# Altium footprint library Pcb-hionyPcbLib.PcbLib: 580 footprints (part 33 of 37)
Each footprint in its own frame and in the unit in brackets; x right, y up, seen from the top. Pads: shape width x height; smd on the part's side, far side on the other; paste and mask are expansions set on the pad; w line width, h text height; cw(c..) or ccw(c..) is an arc to the next point about the centre after c.
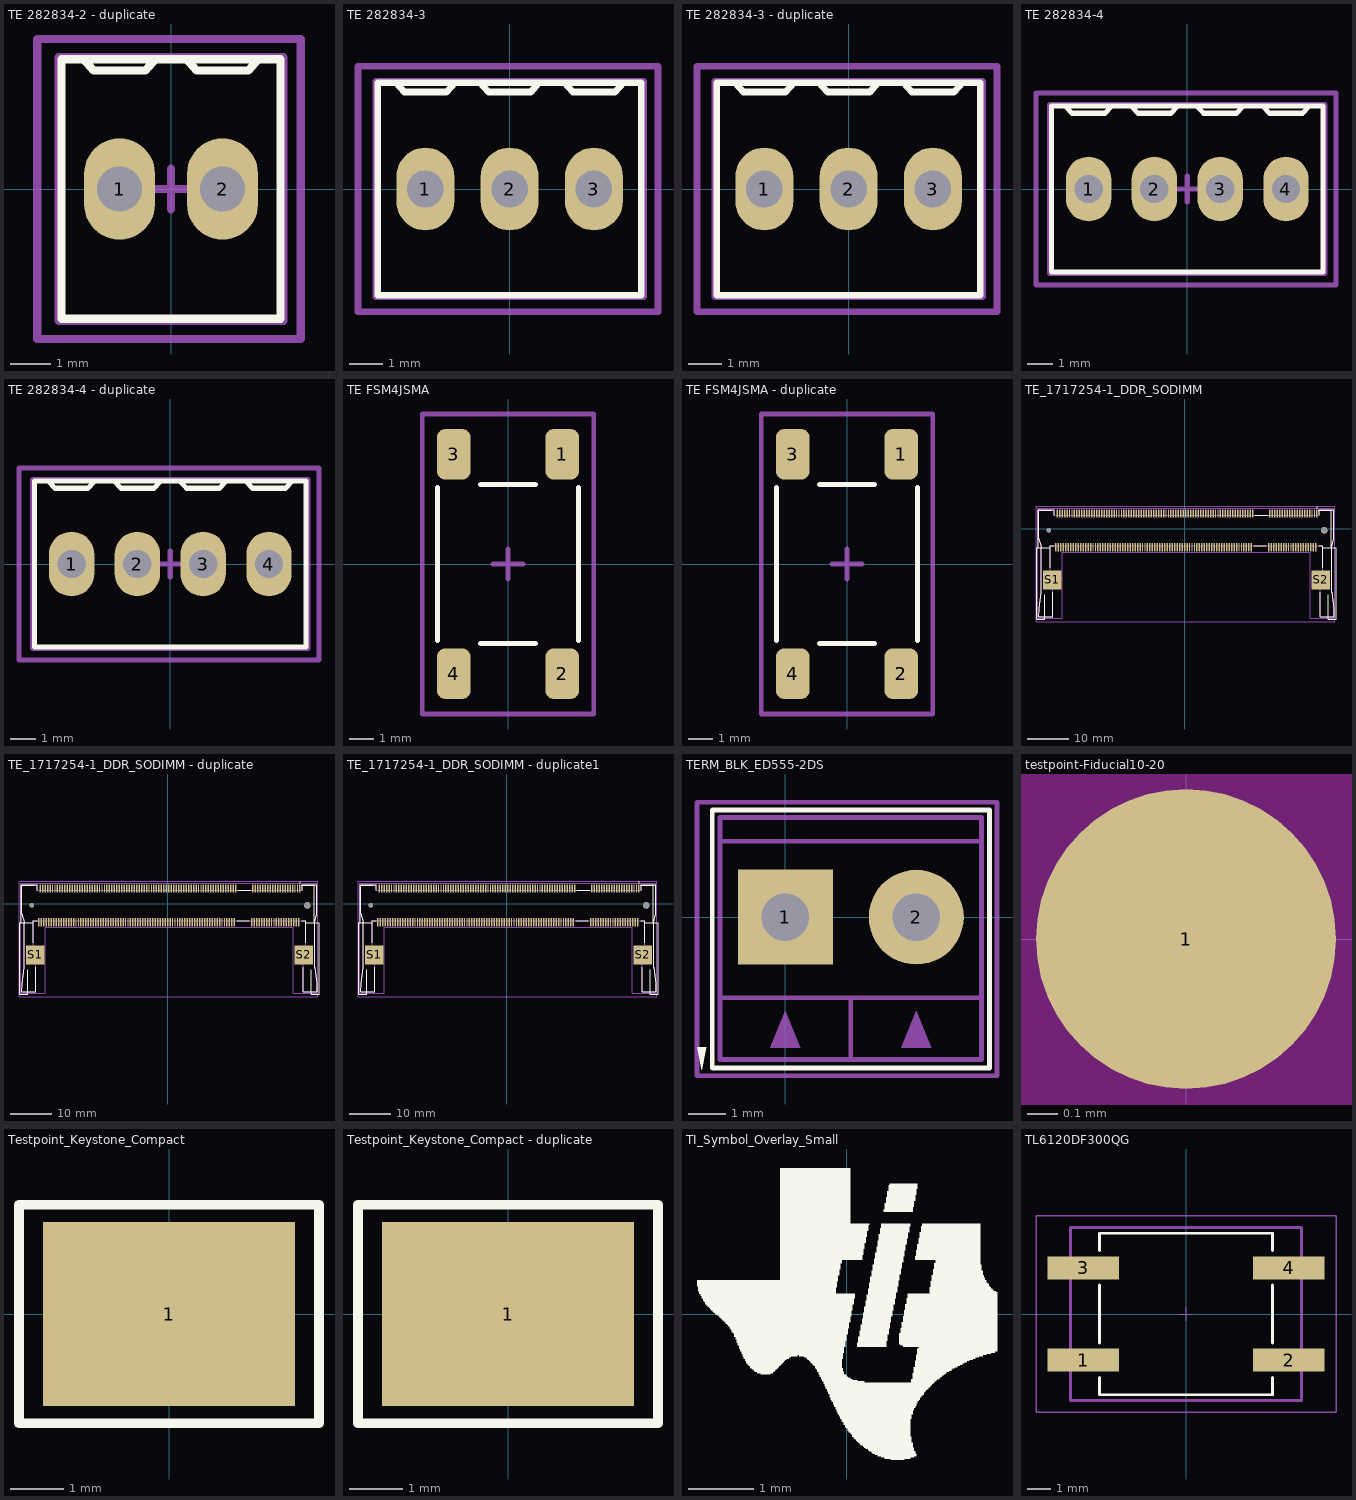
[diagram p32: the footprints below, top view; thin cyan lines are the x and y axes]

## TE 282834-2 - duplicate [mm]
pads (2):
  oval 1.75x2.5 hole 1.1: 1(-1.27,0) 2(1.27,0)
Top Overlay:
  lines w0.2: -2.159,3.2 -1.905,2.921 -0.635,2.921 -0.381,3.2 ; 0.381,3.2 0.635,2.921 1.905,2.921 2.159,3.2 ; -2.7,-3.2 -2.6,-3.2 2.7,-3.2 2.7,3.2 -2.7,3.2 -2.7,-3.2
Mechanical 13:
  lines w0.2: -2.77,-3.25 -2.77,3.25 2.77,3.25 2.77,-3.25 -2.77,-3.25
Mechanical 15:
  lines w0.2: -0.5,0 0.5,0 ; 0,-0.5 0,0.5 ; -3.3,-3.7 3.2,-3.7 3.2,-2.9 3.2,3.7 -3.3,3.7 -3.3,-3.3 -3.3,-3.7
3D body "TE Term Block 2port 282834-2-c-3d.STEP": height 10, standoff -3.4, extent -2.77,-3.25 2.77,3.25

## TE 282834-3 [mm]
pads (3):
  oval 1.75x2.5 hole 1.1: 1(-2.54,0) 2(0,0) 3(2.54,0)
Top Overlay:
  lines w0.2: -3.429,3.2 -3.175,2.921 -1.905,2.921 -1.651,3.2 ; -0.889,3.2 -0.635,2.921 0.635,2.921 0.889,3.2 ; 1.651,3.2 1.905,2.921 3.175,2.921 3.429,3.2 ; -3.97,-3.2 -3.87,-3.2 3.97,-3.2 3.97,3.2 -3.97,3.2 -3.97,-3.2
Mechanical 13:
  lines w0.2: -4.04,-3.25 -4.04,3.25 4.04,3.25 4.04,-3.25 -4.04,-3.25
Mechanical 15:
  lines w0.2: -0.5,0 0.5,0 ; 0,-0.5 0,0.5 ; -4.57,-3.7 4.47,-3.7 4.47,-2.9 4.47,3.7 -4.57,3.7 -4.57,-3.3 -4.57,-3.7
3D body "TE Term Block 3port 282834-3-c-3d.STEP": height 10, standoff -3.4, extent -4.04,-3.25 4.04,3.25

## TE 282834-3 - duplicate [mm]
pads (3):
  oval 1.75x2.5 hole 1.1: 1(-2.54,0) 2(0,0) 3(2.54,0)
Top Overlay:
  lines w0.2: -3.429,3.2 -3.175,2.921 -1.905,2.921 -1.651,3.2 ; -0.889,3.2 -0.635,2.921 0.635,2.921 0.889,3.2 ; 1.651,3.2 1.905,2.921 3.175,2.921 3.429,3.2 ; -3.97,-3.2 -3.87,-3.2 3.97,-3.2 3.97,3.2 -3.97,3.2 -3.97,-3.2
Mechanical 13:
  lines w0.2: -4.04,-3.25 -4.04,3.25 4.04,3.25 4.04,-3.25 -4.04,-3.25
Mechanical 15:
  lines w0.2: -0.5,0 0.5,0 ; 0,-0.5 0,0.5 ; -4.57,-3.7 4.47,-3.7 4.47,-2.9 4.47,3.7 -4.57,3.7 -4.57,-3.3 -4.57,-3.7
3D body "TE Term Block 3port 282834-3-c-3d.STEP": height 10, standoff -3.4, extent -4.04,-3.25 4.04,3.25

## TE 282834-4 [mm]
pads (4):
  oval 1.75x2.5 hole 1.1: 1(-3.81,0) 2(-1.27,0) 3(1.27,0) 4(3.81,0)
Top Overlay:
  lines w0.2: -4.699,3.2 -4.445,2.921 -3.175,2.921 -2.921,3.2 ; -2.159,3.2 -1.905,2.921 -0.635,2.921 -0.381,3.2 ; 0.381,3.2 0.635,2.921 1.905,2.921 2.159,3.2 ; 2.921,3.2 3.175,2.921 4.445,2.921 4.699,3.2 ; -5.24,-3.2 -5.14,-3.2 5.24,-3.2 5.24,3.2 -5.24,3.2 -5.24,-3.2
Mechanical 13:
  lines w0.2: -5.31,-3.25 -5.31,3.25 5.31,3.25 5.31,-3.25 -5.31,-3.25
Mechanical 15:
  lines w0.2: -0.5,0 0.5,0 ; 0,-0.5 0,0.5 ; -5.84,-3.7 5.74,-3.7 5.74,-2.9 5.74,3.7 -5.84,3.7 -5.84,-3.3 -5.84,-3.7
3D body "TE Term Block 4port 282834-4-c-3d.STEP": height 10, standoff -3.4, extent -5.31,-3.25 5.31,3.25

## TE 282834-4 - duplicate [mm]
pads (4):
  oval 1.75x2.5 hole 1.1: 1(-3.81,0) 2(-1.27,0) 3(1.27,0) 4(3.81,0)
Top Overlay:
  lines w0.2: -4.699,3.2 -4.445,2.921 -3.175,2.921 -2.921,3.2 ; -2.159,3.2 -1.905,2.921 -0.635,2.921 -0.381,3.2 ; 0.381,3.2 0.635,2.921 1.905,2.921 2.159,3.2 ; 2.921,3.2 3.175,2.921 4.445,2.921 4.699,3.2 ; -5.24,-3.2 -5.14,-3.2 5.24,-3.2 5.24,3.2 -5.24,3.2 -5.24,-3.2
Mechanical 13:
  lines w0.2: -5.31,-3.25 -5.31,3.25 5.31,3.25 5.31,-3.25 -5.31,-3.25
Mechanical 15:
  lines w0.2: -0.5,0 0.5,0 ; 0,-0.5 0,0.5 ; -5.84,-3.7 5.74,-3.7 5.74,-2.9 5.74,3.7 -5.84,3.7 -5.84,-3.3 -5.84,-3.7
3D body "TE Term Block 4port 282834-4-c-3d.STEP": height 10, standoff -3.4, extent -5.31,-3.25 5.31,3.25

## TE FSM4JSMA [mm]
pads (4):
  rrect50% 1.4x2.1 smd: 1(2.25,4.55) 2(2.25,-4.55) 3(-2.25,4.55) 4(-2.25,-4.55)
Top Overlay:
  lines w0.2: -2.921,-3.175 -2.921,3.175 ; -1.143,-3.302 1.143,-3.302 ; -1.143,3.302 1.143,3.302 ; 2.921,-3.175 2.921,3.175
Mechanical 15:
  lines w0.2: -0.635,0 0.635,0 ; 0,-0.635 0,0.635 ; -3.556,-6.223 -3.556,6.223 3.556,6.223 3.556,-6.223 -3.556,-6.223
3D body "FSM4JSMA.STEP": height 5.08, standoff 0, extent -3,-5 3,5

## TE FSM4JSMA - duplicate [mm]
pads (4):
  rrect50% 1.4x2.1 smd: 1(2.25,4.55) 2(2.25,-4.55) 3(-2.25,4.55) 4(-2.25,-4.55)
Top Overlay:
  lines w0.2: -2.921,-3.175 -2.921,3.175 ; -1.143,-3.302 1.143,-3.302 ; -1.143,3.302 1.143,3.302 ; 2.921,-3.175 2.921,3.175
Mechanical 15:
  lines w0.2: -0.635,0 0.635,0 ; 0,-0.635 0,0.635 ; -3.556,-6.223 -3.556,6.223 3.556,6.223 3.556,-6.223 -3.556,-6.223
3D body "FSM4JSMA.STEP": height 5.08, standoff 0, extent -3,-5 3,5

## TE_1717254-1_DDR_SODIMM [mm]
pads (204):
  rect 0.35x2 smd mask+0.05: 1(32.025,3.75) 2(31.725,-4.45) 3(31.425,3.75) 4(31.125,-4.45) 5(30.825,3.75) 6(30.525,-4.45) 7(30.225,3.75) 8(29.925,-4.45) 9(29.625,3.75) 10(29.325,-4.45) 11(29.025,3.75) 12(28.725,-4.45) 13(28.425,3.75) 14(28.125,-4.45) 15(27.825,3.75) 16(27.525,-4.45) 17(27.225,3.75) 18(26.925,-4.45) 19(26.625,3.75) 20(26.325,-4.45) 21(26.025,3.75) 22(25.725,-4.45) 23(25.425,3.75) 24(25.125,-4.45) 25(24.825,3.75) 26(24.525,-4.45) 27(24.225,3.75) 28(23.925,-4.45) 29(23.625,3.75) 30(23.325,-4.45) 31(23.025,3.75) 32(22.725,-4.45) 33(22.425,3.75) 34(22.125,-4.45) 35(21.825,3.75) 36(21.525,-4.45) 37(21.225,3.75) 38(20.925,-4.45) 39(20.625,3.75) 40(20.325,-4.45) 41(16.425,3.75) 42(16.125,-4.45) 43(15.825,3.75) 44(15.525,-4.45) 45(15.225,3.75) 46(14.925,-4.45) 47(14.625,3.75) 48(14.325,-4.45) 49(14.025,3.75) 50(13.725,-4.45) 51(13.425,3.75) 52(13.125,-4.45) 53(12.825,3.75) 54(12.525,-4.45) 55(12.225,3.75) 56(11.925,-4.45) 57(11.625,3.75) 58(11.325,-4.45) 59(11.025,3.75) 60(10.725,-4.45) 61(10.425,3.75) 62(10.125,-4.45) 63(9.825,3.75) 64(9.525,-4.45) 65(9.225,3.75) 66(8.925,-4.45) 67(8.625,3.75) 68(8.325,-4.45) 69(8.025,3.75) 70(7.725,-4.45) 71(7.425,3.75) 72(7.125,-4.45) 73(6.825,3.75) 74(6.525,-4.45) 75(6.225,3.75) 76(5.925,-4.45) 77(5.625,3.75) 78(5.325,-4.45) 79(5.025,3.75) 80(4.725,-4.45) 81(4.425,3.75) 82(4.125,-4.45) 83(3.825,3.75) 84(3.525,-4.45) 85(3.225,3.75) 86(2.925,-4.45) 87(2.625,3.75) 88(2.325,-4.45) 89(2.025,3.75) 90(1.725,-4.45) 91(1.425,3.75) 92(1.125,-4.45) 93(0.825,3.75) 94(0.525,-4.45) 95(0.225,3.75) 96(-0.075,-4.45) 97(-0.375,3.75) 98(-0.675,-4.45) 99(-0.975,3.75) 100(-1.275,-4.45) 101(-1.575,3.75) 102(-1.875,-4.45) 103(-2.175,3.75) 104(-2.475,-4.45) 105(-2.775,3.75) 106(-3.075,-4.45) 107(-3.375,3.75) 108(-3.675,-4.45) 109(-3.975,3.75) 110(-4.275,-4.45) 111(-4.575,3.75) 112(-4.875,-4.45) 113(-5.175,3.75) 114(-5.475,-4.45) 115(-5.775,3.75) 116(-6.075,-4.45) 117(-6.375,3.75) 118(-6.675,-4.45) 119(-6.975,3.75) 120(-7.275,-4.45) 121(-7.575,3.75) 122(-7.875,-4.45) 123(-8.175,3.75) 124(-8.475,-4.45) 125(-8.775,3.75) 126(-9.075,-4.45) 127(-9.375,3.75) 128(-9.675,-4.45) 129(-9.975,3.75) 130(-10.275,-4.45) 131(-10.575,3.75) 132(-10.875,-4.45) 133(-11.175,3.75) 134(-11.475,-4.45) 135(-11.775,3.75) 136(-12.075,-4.45) 137(-12.375,3.75) 138(-12.675,-4.45) 139(-12.975,3.75) 140(-13.275,-4.45) 141(-13.575,3.75) 142(-13.875,-4.45) 143(-14.175,3.75) 144(-14.475,-4.45) 145(-14.775,3.75) 146(-15.075,-4.45) 147(-15.375,3.75) 148(-15.675,-4.45) 149(-15.975,3.75) 150(-16.275,-4.45) 151(-16.575,3.75) 152(-16.875,-4.45) 153(-17.175,3.75) 154(-17.475,-4.45) 155(-17.775,3.75) 156(-18.075,-4.45) 157(-18.375,3.75) 158(-18.675,-4.45) 159(-18.975,3.75) 160(-19.275,-4.45) 161(-19.575,3.75) 162(-19.875,-4.45) 163(-20.175,3.75) 164(-20.475,-4.45) 165(-20.775,3.75) 166(-21.075,-4.45) 167(-21.375,3.75) 168(-21.675,-4.45) 169(-21.975,3.75) 170(-22.275,-4.45) 171(-22.575,3.75) 172(-22.875,-4.45) 173(-23.175,3.75) 174(-23.475,-4.45) 175(-23.775,3.75) 176(-24.075,-4.45) 177(-24.375,3.75) 178(-24.675,-4.45) 179(-24.975,3.75) 180(-25.275,-4.45) 181(-25.575,3.75) 182(-25.875,-4.45) 183(-26.175,3.75) 184(-26.475,-4.45) 185(-26.775,3.75) 186(-27.075,-4.45) 187(-27.375,3.75) 188(-27.675,-4.45) 189(-27.975,3.75) 190(-28.275,-4.45) 191(-28.575,3.75) 192(-28.875,-4.45) 193(-29.175,3.75) 194(-29.475,-4.45) 195(-29.775,3.75) 196(-30.075,-4.45) 197(-30.375,3.75) 198(-30.675,-4.45) 199(-30.975,3.75) 200(-31.275,-4.45)
  round 1.1 hole 1.1 unplated: None(-33.025,-0.35)
  round 1.6 hole 1.6 unplated: None(33.775,-0.35)
  rect 4.5x4.6 smd: S1(-32.175,-12.35) S2(32.925,-12.35)
Top Overlay:
  circle w0.15: c32.025,5.2 r0.1
  lines w0.15: -35.512,-4.505 -35.891,-4.505 -35.891,-21.923 -34.031,-21.923 -34.031,-15.999 ; -35.375,-21.35 -32.025,-21.35 -32.025,-15.35 ; -35.375,-21.3 -35.325,-19.35 -34.825,-15.35 -34.825,-4.4 -35.375,-2.35 -35.375,4.65 -31.625,4.65 -31.625,3.35 ; -32.625,-9.35 -32.625,-4.05 -31.725,-4.05 ; -32.625,-4.505 -35.5,-4.505 -35.5,4.5 -32.385,4.5 ; 16.675,-4.05 19.675,-4.05 ; 16.975,3.35 20.075,3.35 ; 32.385,4.499 35.5,4.499 35.5,-4.505 ; 32.475,-4.05 33.375,-4.05 33.375,-9.35 ; 32.575,3.35 32.575,4.65 36.125,4.65 36.125,-2.35 35.575,-4.4 35.575,-15.35 36.075,-19.35 36.125,-21.3 ; 32.775,-15.35 32.775,-21.35 36.125,-21.35 ; 33.375,-4.505 36.25,-4.505 ; 34.781,-15.999 34.781,-21.923 36.641,-21.923 36.641,-4.505 36.262,-4.505
Mechanical 13:
  lines w0.05: -35.625,-21.6 -35.625,5 36.375,5 36.375,-21.6 30.425,-21.6 30.425,-5.7 -29.675,-5.7 -29.675,-21.6 -35.625,-21.6
  lines w0.127: -35.375,-21.35 -32.025,-21.35 -32.025,-14.05 -31.275,-14.05 -31.275,-10.45 -32.625,-10.45 -32.625,-4.05 33.375,-4.05 33.375,-10.45 32.025,-10.45 32.025,-14.05 32.775,-14.05 32.775,-21.35 36.065,-21.35 ; -35.375,-21.3 -35.325,-19.35 -34.825,-15.35 -34.825,-4.4 -35.375,-2.35 -35.375,4.65 -31.625,4.65 -31.625,3.35 32.575,3.35 32.575,4.65 36.125,4.65 36.125,-2.35 35.575,-4.4 35.575,-15.35 36.075,-19.35 36.075,-21.34
Mechanical 15:
  lines w0.3: -36.1,-22.5 -36.1,5.5 36.3,5.5 36.3,-22.5 -36.1,-22.5
  text ".Designator" at 0,0 h0.55
  text "1" at 31.5,4 h0.55
  text "2" at 31.5,-4.5 h0.55
  text "40" at 19,-4.5 h0.55
  text "39" at 19.5,3.5 h0.55
  text "41" at 16,3.5 h0.55
  text "42" at 16,-4.5 h0.55
  text "200" at -33,-4.5 h0.55
  text "199" at -33,3.5 h0.55
3D body "User Library-compute_module.step": height 4.1, standoff 2.6, extent -33.55,-30.5 34.05,-0.5
3D body "c-1473005-4-j1-3d.stp": height 5.27, standoff -0.63, extent -35.375,-21.425 36.125,4.625

## TE_1717254-1_DDR_SODIMM - duplicate [mm]
pads (204):
  rect 0.35x2 smd mask+0.05: 1(32.025,3.75) 2(31.725,-4.45) 3(31.425,3.75) 4(31.125,-4.45) 5(30.825,3.75) 6(30.525,-4.45) 7(30.225,3.75) 8(29.925,-4.45) 9(29.625,3.75) 10(29.325,-4.45) 11(29.025,3.75) 12(28.725,-4.45) 13(28.425,3.75) 14(28.125,-4.45) 15(27.825,3.75) 16(27.525,-4.45) 17(27.225,3.75) 18(26.925,-4.45) 19(26.625,3.75) 20(26.325,-4.45) 21(26.025,3.75) 22(25.725,-4.45) 23(25.425,3.75) 24(25.125,-4.45) 25(24.825,3.75) 26(24.525,-4.45) 27(24.225,3.75) 28(23.925,-4.45) 29(23.625,3.75) 30(23.325,-4.45) 31(23.025,3.75) 32(22.725,-4.45) 33(22.425,3.75) 34(22.125,-4.45) 35(21.825,3.75) 36(21.525,-4.45) 37(21.225,3.75) 38(20.925,-4.45) 39(20.625,3.75) 40(20.325,-4.45) 41(16.425,3.75) 42(16.125,-4.45) 43(15.825,3.75) 44(15.525,-4.45) 45(15.225,3.75) 46(14.925,-4.45) 47(14.625,3.75) 48(14.325,-4.45) 49(14.025,3.75) 50(13.725,-4.45) 51(13.425,3.75) 52(13.125,-4.45) 53(12.825,3.75) 54(12.525,-4.45) 55(12.225,3.75) 56(11.925,-4.45) 57(11.625,3.75) 58(11.325,-4.45) 59(11.025,3.75) 60(10.725,-4.45) 61(10.425,3.75) 62(10.125,-4.45) 63(9.825,3.75) 64(9.525,-4.45) 65(9.225,3.75) 66(8.925,-4.45) 67(8.625,3.75) 68(8.325,-4.45) 69(8.025,3.75) 70(7.725,-4.45) 71(7.425,3.75) 72(7.125,-4.45) 73(6.825,3.75) 74(6.525,-4.45) 75(6.225,3.75) 76(5.925,-4.45) 77(5.625,3.75) 78(5.325,-4.45) 79(5.025,3.75) 80(4.725,-4.45) 81(4.425,3.75) 82(4.125,-4.45) 83(3.825,3.75) 84(3.525,-4.45) 85(3.225,3.75) 86(2.925,-4.45) 87(2.625,3.75) 88(2.325,-4.45) 89(2.025,3.75) 90(1.725,-4.45) 91(1.425,3.75) 92(1.125,-4.45) 93(0.825,3.75) 94(0.525,-4.45) 95(0.225,3.75) 96(-0.075,-4.45) 97(-0.375,3.75) 98(-0.675,-4.45) 99(-0.975,3.75) 100(-1.275,-4.45) 101(-1.575,3.75) 102(-1.875,-4.45) 103(-2.175,3.75) 104(-2.475,-4.45) 105(-2.775,3.75) 106(-3.075,-4.45) 107(-3.375,3.75) 108(-3.675,-4.45) 109(-3.975,3.75) 110(-4.275,-4.45) 111(-4.575,3.75) 112(-4.875,-4.45) 113(-5.175,3.75) 114(-5.475,-4.45) 115(-5.775,3.75) 116(-6.075,-4.45) 117(-6.375,3.75) 118(-6.675,-4.45) 119(-6.975,3.75) 120(-7.275,-4.45) 121(-7.575,3.75) 122(-7.875,-4.45) 123(-8.175,3.75) 124(-8.475,-4.45) 125(-8.775,3.75) 126(-9.075,-4.45) 127(-9.375,3.75) 128(-9.675,-4.45) 129(-9.975,3.75) 130(-10.275,-4.45) 131(-10.575,3.75) 132(-10.875,-4.45) 133(-11.175,3.75) 134(-11.475,-4.45) 135(-11.775,3.75) 136(-12.075,-4.45) 137(-12.375,3.75) 138(-12.675,-4.45) 139(-12.975,3.75) 140(-13.275,-4.45) 141(-13.575,3.75) 142(-13.875,-4.45) 143(-14.175,3.75) 144(-14.475,-4.45) 145(-14.775,3.75) 146(-15.075,-4.45) 147(-15.375,3.75) 148(-15.675,-4.45) 149(-15.975,3.75) 150(-16.275,-4.45) 151(-16.575,3.75) 152(-16.875,-4.45) 153(-17.175,3.75) 154(-17.475,-4.45) 155(-17.775,3.75) 156(-18.075,-4.45) 157(-18.375,3.75) 158(-18.675,-4.45) 159(-18.975,3.75) 160(-19.275,-4.45) 161(-19.575,3.75) 162(-19.875,-4.45) 163(-20.175,3.75) 164(-20.475,-4.45) 165(-20.775,3.75) 166(-21.075,-4.45) 167(-21.375,3.75) 168(-21.675,-4.45) 169(-21.975,3.75) 170(-22.275,-4.45) 171(-22.575,3.75) 172(-22.875,-4.45) 173(-23.175,3.75) 174(-23.475,-4.45) 175(-23.775,3.75) 176(-24.075,-4.45) 177(-24.375,3.75) 178(-24.675,-4.45) 179(-24.975,3.75) 180(-25.275,-4.45) 181(-25.575,3.75) 182(-25.875,-4.45) 183(-26.175,3.75) 184(-26.475,-4.45) 185(-26.775,3.75) 186(-27.075,-4.45) 187(-27.375,3.75) 188(-27.675,-4.45) 189(-27.975,3.75) 190(-28.275,-4.45) 191(-28.575,3.75) 192(-28.875,-4.45) 193(-29.175,3.75) 194(-29.475,-4.45) 195(-29.775,3.75) 196(-30.075,-4.45) 197(-30.375,3.75) 198(-30.675,-4.45) 199(-30.975,3.75) 200(-31.275,-4.45)
  round 1.1 hole 1.1 unplated: None(-33.025,-0.35)
  round 1.6 hole 1.6 unplated: None(33.775,-0.35)
  rect 4.5x4.6 smd: S1(-32.175,-12.35) S2(32.925,-12.35)
Top Overlay:
  circle w0.15: c32.025,5.2 r0.1
  lines w0.15: -35.512,-4.505 -35.891,-4.505 -35.891,-21.923 -34.031,-21.923 -34.031,-15.999 ; -35.375,-21.35 -32.025,-21.35 -32.025,-15.35 ; -35.375,-21.3 -35.325,-19.35 -34.825,-15.35 -34.825,-4.4 -35.375,-2.35 -35.375,4.65 -31.625,4.65 -31.625,3.35 ; -32.625,-9.35 -32.625,-4.05 -31.725,-4.05 ; -32.625,-4.505 -35.5,-4.505 -35.5,4.5 -32.385,4.5 ; 16.675,-4.05 19.675,-4.05 ; 16.975,3.35 20.075,3.35 ; 32.385,4.499 35.5,4.499 35.5,-4.505 ; 32.475,-4.05 33.375,-4.05 33.375,-9.35 ; 32.575,3.35 32.575,4.65 36.125,4.65 36.125,-2.35 35.575,-4.4 35.575,-15.35 36.075,-19.35 36.125,-21.3 ; 32.775,-15.35 32.775,-21.35 36.125,-21.35 ; 33.375,-4.505 36.25,-4.505 ; 34.781,-15.999 34.781,-21.923 36.641,-21.923 36.641,-4.505 36.262,-4.505
Mechanical 13:
  lines w0.05: -35.625,-21.6 -29.675,-21.6 -29.675,-5.7 30.425,-5.7 30.425,-21.6 36.375,-21.6 36.375,5 -35.625,5 -35.625,-21.6
  lines w0.127: -35.375,-21.35 -32.025,-21.35 -32.025,-14.05 -31.275,-14.05 -31.275,-10.45 -32.625,-10.45 -32.625,-4.05 33.375,-4.05 33.375,-10.45 32.025,-10.45 32.025,-14.05 32.775,-14.05 32.775,-21.35 36.065,-21.35 ; -35.375,-21.3 -35.325,-19.35 -34.825,-15.35 -34.825,-4.4 -35.375,-2.35 -35.375,4.65 -31.625,4.65 -31.625,3.35 32.575,3.35 32.575,4.65 36.125,4.65 36.125,-2.35 35.575,-4.4 35.575,-15.35 36.075,-19.35 36.075,-21.34
Mechanical 15:
  lines w0.3: -36.1,-22.5 36.3,-22.5 36.3,5.5 -36.1,5.5 -36.1,-22.5
  text "199" at -33,3.5 h0.55
  text "200" at -33,-4.5 h0.55
  text "42" at 16,-4.5 h0.55
  text "41" at 16,3.5 h0.55
  text "39" at 19.5,3.5 h0.55
  text "40" at 19,-4.5 h0.55
  text "2" at 31.5,-4.5 h0.55
  text "1" at 31.5,4 h0.55
  text ".Designator" at 0,0 h0.55
3D body "c-1473005-4-j1-3d.stp": height 5.27, standoff -0.63, extent -35.375,-21.425 36.125,4.625
3D body "User Library-compute_module.step": height 4.1, standoff 2.6, extent -33.55,-30.5 34.05,-0.5

## TE_1717254-1_DDR_SODIMM - duplicate1 [mm]
pads (204):
  rect 0.35x2 smd mask+0.05: 1(32.025,3.75) 2(31.725,-4.45) 3(31.425,3.75) 4(31.125,-4.45) 5(30.825,3.75) 6(30.525,-4.45) 7(30.225,3.75) 8(29.925,-4.45) 9(29.625,3.75) 10(29.325,-4.45) 11(29.025,3.75) 12(28.725,-4.45) 13(28.425,3.75) 14(28.125,-4.45) 15(27.825,3.75) 16(27.525,-4.45) 17(27.225,3.75) 18(26.925,-4.45) 19(26.625,3.75) 20(26.325,-4.45) 21(26.025,3.75) 22(25.725,-4.45) 23(25.425,3.75) 24(25.125,-4.45) 25(24.825,3.75) 26(24.525,-4.45) 27(24.225,3.75) 28(23.925,-4.45) 29(23.625,3.75) 30(23.325,-4.45) 31(23.025,3.75) 32(22.725,-4.45) 33(22.425,3.75) 34(22.125,-4.45) 35(21.825,3.75) 36(21.525,-4.45) 37(21.225,3.75) 38(20.925,-4.45) 39(20.625,3.75) 40(20.325,-4.45) 41(16.425,3.75) 42(16.125,-4.45) 43(15.825,3.75) 44(15.525,-4.45) 45(15.225,3.75) 46(14.925,-4.45) 47(14.625,3.75) 48(14.325,-4.45) 49(14.025,3.75) 50(13.725,-4.45) 51(13.425,3.75) 52(13.125,-4.45) 53(12.825,3.75) 54(12.525,-4.45) 55(12.225,3.75) 56(11.925,-4.45) 57(11.625,3.75) 58(11.325,-4.45) 59(11.025,3.75) 60(10.725,-4.45) 61(10.425,3.75) 62(10.125,-4.45) 63(9.825,3.75) 64(9.525,-4.45) 65(9.225,3.75) 66(8.925,-4.45) 67(8.625,3.75) 68(8.325,-4.45) 69(8.025,3.75) 70(7.725,-4.45) 71(7.425,3.75) 72(7.125,-4.45) 73(6.825,3.75) 74(6.525,-4.45) 75(6.225,3.75) 76(5.925,-4.45) 77(5.625,3.75) 78(5.325,-4.45) 79(5.025,3.75) 80(4.725,-4.45) 81(4.425,3.75) 82(4.125,-4.45) 83(3.825,3.75) 84(3.525,-4.45) 85(3.225,3.75) 86(2.925,-4.45) 87(2.625,3.75) 88(2.325,-4.45) 89(2.025,3.75) 90(1.725,-4.45) 91(1.425,3.75) 92(1.125,-4.45) 93(0.825,3.75) 94(0.525,-4.45) 95(0.225,3.75) 96(-0.075,-4.45) 97(-0.375,3.75) 98(-0.675,-4.45) 99(-0.975,3.75) 100(-1.275,-4.45) 101(-1.575,3.75) 102(-1.875,-4.45) 103(-2.175,3.75) 104(-2.475,-4.45) 105(-2.775,3.75) 106(-3.075,-4.45) 107(-3.375,3.75) 108(-3.675,-4.45) 109(-3.975,3.75) 110(-4.275,-4.45) 111(-4.575,3.75) 112(-4.875,-4.45) 113(-5.175,3.75) 114(-5.475,-4.45) 115(-5.775,3.75) 116(-6.075,-4.45) 117(-6.375,3.75) 118(-6.675,-4.45) 119(-6.975,3.75) 120(-7.275,-4.45) 121(-7.575,3.75) 122(-7.875,-4.45) 123(-8.175,3.75) 124(-8.475,-4.45) 125(-8.775,3.75) 126(-9.075,-4.45) 127(-9.375,3.75) 128(-9.675,-4.45) 129(-9.975,3.75) 130(-10.275,-4.45) 131(-10.575,3.75) 132(-10.875,-4.45) 133(-11.175,3.75) 134(-11.475,-4.45) 135(-11.775,3.75) 136(-12.075,-4.45) 137(-12.375,3.75) 138(-12.675,-4.45) 139(-12.975,3.75) 140(-13.275,-4.45) 141(-13.575,3.75) 142(-13.875,-4.45) 143(-14.175,3.75) 144(-14.475,-4.45) 145(-14.775,3.75) 146(-15.075,-4.45) 147(-15.375,3.75) 148(-15.675,-4.45) 149(-15.975,3.75) 150(-16.275,-4.45) 151(-16.575,3.75) 152(-16.875,-4.45) 153(-17.175,3.75) 154(-17.475,-4.45) 155(-17.775,3.75) 156(-18.075,-4.45) 157(-18.375,3.75) 158(-18.675,-4.45) 159(-18.975,3.75) 160(-19.275,-4.45) 161(-19.575,3.75) 162(-19.875,-4.45) 163(-20.175,3.75) 164(-20.475,-4.45) 165(-20.775,3.75) 166(-21.075,-4.45) 167(-21.375,3.75) 168(-21.675,-4.45) 169(-21.975,3.75) 170(-22.275,-4.45) 171(-22.575,3.75) 172(-22.875,-4.45) 173(-23.175,3.75) 174(-23.475,-4.45) 175(-23.775,3.75) 176(-24.075,-4.45) 177(-24.375,3.75) 178(-24.675,-4.45) 179(-24.975,3.75) 180(-25.275,-4.45) 181(-25.575,3.75) 182(-25.875,-4.45) 183(-26.175,3.75) 184(-26.475,-4.45) 185(-26.775,3.75) 186(-27.075,-4.45) 187(-27.375,3.75) 188(-27.675,-4.45) 189(-27.975,3.75) 190(-28.275,-4.45) 191(-28.575,3.75) 192(-28.875,-4.45) 193(-29.175,3.75) 194(-29.475,-4.45) 195(-29.775,3.75) 196(-30.075,-4.45) 197(-30.375,3.75) 198(-30.675,-4.45) 199(-30.975,3.75) 200(-31.275,-4.45)
  round 1.1 hole 1.1 unplated: None(-33.025,-0.35)
  round 1.6 hole 1.6 unplated: None(33.775,-0.35)
  rect 4.5x4.6 smd: S1(-32.175,-12.35) S2(32.925,-12.35)
Top Overlay:
  circle w0.15: c32.025,5.2 r0.1
  lines w0.15: -35.512,-4.505 -35.891,-4.505 -35.891,-21.923 -34.031,-21.923 -34.031,-15.999 ; -35.375,-21.35 -32.025,-21.35 -32.025,-15.35 ; -35.375,-21.3 -35.325,-19.35 -34.825,-15.35 -34.825,-4.4 -35.375,-2.35 -35.375,4.65 -31.625,4.65 -31.625,3.35 ; -32.625,-9.35 -32.625,-4.05 -31.725,-4.05 ; -32.625,-4.505 -35.5,-4.505 -35.5,4.5 -32.385,4.5 ; 16.675,-4.05 19.675,-4.05 ; 16.975,3.35 20.075,3.35 ; 32.385,4.499 35.5,4.499 35.5,-4.505 ; 32.475,-4.05 33.375,-4.05 33.375,-9.35 ; 32.575,3.35 32.575,4.65 36.125,4.65 36.125,-2.35 35.575,-4.4 35.575,-15.35 36.075,-19.35 36.125,-21.3 ; 32.775,-15.35 32.775,-21.35 36.125,-21.35 ; 33.375,-4.505 36.25,-4.505 ; 34.781,-15.999 34.781,-21.923 36.641,-21.923 36.641,-4.505 36.262,-4.505
Mechanical 13:
  lines w0.05: -35.625,-21.6 -29.675,-21.6 -29.675,-5.7 30.425,-5.7 30.425,-21.6 36.375,-21.6 36.375,5 -35.625,5 -35.625,-21.6
  lines w0.127: -35.375,-21.35 -32.025,-21.35 -32.025,-14.05 -31.275,-14.05 -31.275,-10.45 -32.625,-10.45 -32.625,-4.05 33.375,-4.05 33.375,-10.45 32.025,-10.45 32.025,-14.05 32.775,-14.05 32.775,-21.35 36.065,-21.35 ; -35.375,-21.3 -35.325,-19.35 -34.825,-15.35 -34.825,-4.4 -35.375,-2.35 -35.375,4.65 -31.625,4.65 -31.625,3.35 32.575,3.35 32.575,4.65 36.125,4.65 36.125,-2.35 35.575,-4.4 35.575,-15.35 36.075,-19.35 36.075,-21.34
Mechanical 15:
  lines w0.3: -36.1,-22.5 36.3,-22.5 36.3,5.5 -36.1,5.5 -36.1,-22.5
  text "199" at -33,3.5 h0.55
  text "200" at -33,-4.5 h0.55
  text "42" at 16,-4.5 h0.55
  text "41" at 16,3.5 h0.55
  text "39" at 19.5,3.5 h0.55
  text "40" at 19,-4.5 h0.55
  text "2" at 31.5,-4.5 h0.55
  text "1" at 31.5,4 h0.55
  text ".Designator" at 0,0 h0.55
3D body "c-1473005-4-j1-3d.stp": height 5.27, standoff -0.63, extent -35.375,-21.425 36.125,4.625
3D body "User Library-compute_module.step": height 4.1, standoff 2.6, extent -33.55,-30.5 34.05,-0.5

## TERM_BLK_ED555-2DS [mil]
pads (2):
  rect 100x100 hole 50: 1(0,0)
  round 100 hole 50: 2(138,0)
Top Overlay:
  region: -88,-161 -83,-137 -93,-137
  lines w5: -77,-159 -77,113 215,113 215,-159 -77,-159
Top 3D Body:
  region: 15.75,-137.8 -15.75,-137.8 0,-98.43
  region: 153.54,-137.8 122.05,-137.8 137.8,-98.43
  lines w5: -68.9,-85 206.69,-85 ; -68.9,80 206.69,80 ; 68.9,-150.2 68.9,-85 ; -68.9,-150 -68.9,105 206.69,105 206.69,-150 -68.9,-150
  text ".Designator" at -23.62,-23.62 h40
Mechanical 15:
  lines w5: -93,-167 223,-167 223,121 -93,121 -93,-167
3D body "On-Shore_ED555_2DS.stp": height 323.43, standoff -137.2, extent -68.7,-149.61 206.89,106.29

## testpoint-Fiducial10-20 [mm]
pads (1):
  round 1 smd mask+0.5: 1(0,0)
Top Layer keep-out:
  circle w1.178: c0,0 r0.5

## Testpoint_Keystone_Compact [mil]
pads (1):
  rect 185x135 smd: 1(0,0)
Top Overlay:
  lines w7: -110,-80 -110,-70 -110,70 -110,80 -100,80 -30,80 110,80 110,-80 -100,-80 -110,-80
Top 3D Body:
  lines w5: -65.33,-22.51 -63.43,-23.14 ; -63.92,21.31 -54.27,57.33 63.59,25.75 ; -63.09,21.31 -74.92,21.31 -74.92,-18.69 -75,-20 -74.85,-20.08 -63.43,-23.14 ; 63.25,-18.69 75.08,-18.69 75.08,21.31 75.16,22.61 75.01,22.69 63.59,25.75 ; 64.08,-18.69 54.43,-54.72 -63.43,-23.14 ; 65.49,25.13 63.59,25.75
  text ".Designator" at -55,-5 h30
3D body "keystone_5016.stp": height 90.6, standoff 0.6, extent -75.08,-56.03 75.08,56.03

## Testpoint_Keystone_Compact - duplicate [mil]
pads (1):
  rect 185x135 smd: 1(0,0)
Top Overlay:
  lines w7: -110,-80 -110,-70 -110,70 -110,80 -100,80 -30,80 110,80 110,-80 -100,-80 -110,-80
Top 3D Body:
  lines w5: -65.33,-22.51 -63.43,-23.14 ; -63.92,21.31 -54.27,57.33 63.59,25.75 ; -63.09,21.31 -74.92,21.31 -74.92,-18.69 -75,-20 -74.85,-20.08 -63.43,-23.14 ; 63.25,-18.69 75.08,-18.69 75.08,21.31 75.16,22.61 75.01,22.69 63.59,25.75 ; 64.08,-18.69 54.43,-54.72 -63.43,-23.14 ; 65.49,25.13 63.59,25.75
  text ".Designator" at -55,-5 h30
3D body "keystone_5016.stp": height 90.6, standoff 0.6, extent -75.08,-56.03 75.08,56.03

## TI_Symbol_Overlay_Small [mm]
Top Overlay:
  drawing of 3 lines, arcs and shapes, not listed

## TL6120DF300QG [mm]
pads (4):
  rect 3.1x1 smd: 1(-4.45,-2) 2(4.45,-2) 3(-4.45,2) 4(4.45,2)
Top Overlay:
  lines w0.127: -3.75,-2.75 -3.75,-3.5 3.75,-3.5 3.75,-2.75 ; -3.75,-1.25 -3.75,1.25 ; -3.75,2.75 -3.75,3.5 3.75,3.5 3.75,2.75 ; 3.75,-1.25 3.75,1.25
Mechanical 11:
  text ".Designator" at 0.898,0.031 h0.5
Mechanical 13:
  lines w0.127: -5,-3.75 5,-3.75 5,3.75 -5,3.75 -5,-3.75
Mechanical 15:
  lines w0.05: -0.3,0 0.3,0 ; 0,-0.3 0,0.3
  lines w0.064: -6.5,-4.25 6.5,-4.25 6.5,4.25 -6.5,4.25 -6.5,-4.25
3D body "TL6120DFxxxxG.stp": height 10.01, standoff -0.09, extent -5,-3.7 5,3.7